# Altium footprint library LimeMicroAltiumLib.PcbLib: 760 footprints (part 22 of 50)
Each footprint in its own frame and in the unit in brackets; x right, y up, seen from the top. Pads: shape width x height; smd on the part's side, far side on the other; paste and mask are expansions set on the pad; w line width, h text height; cw(c..) or ccw(c..) is an arc to the next point about the centre after c.
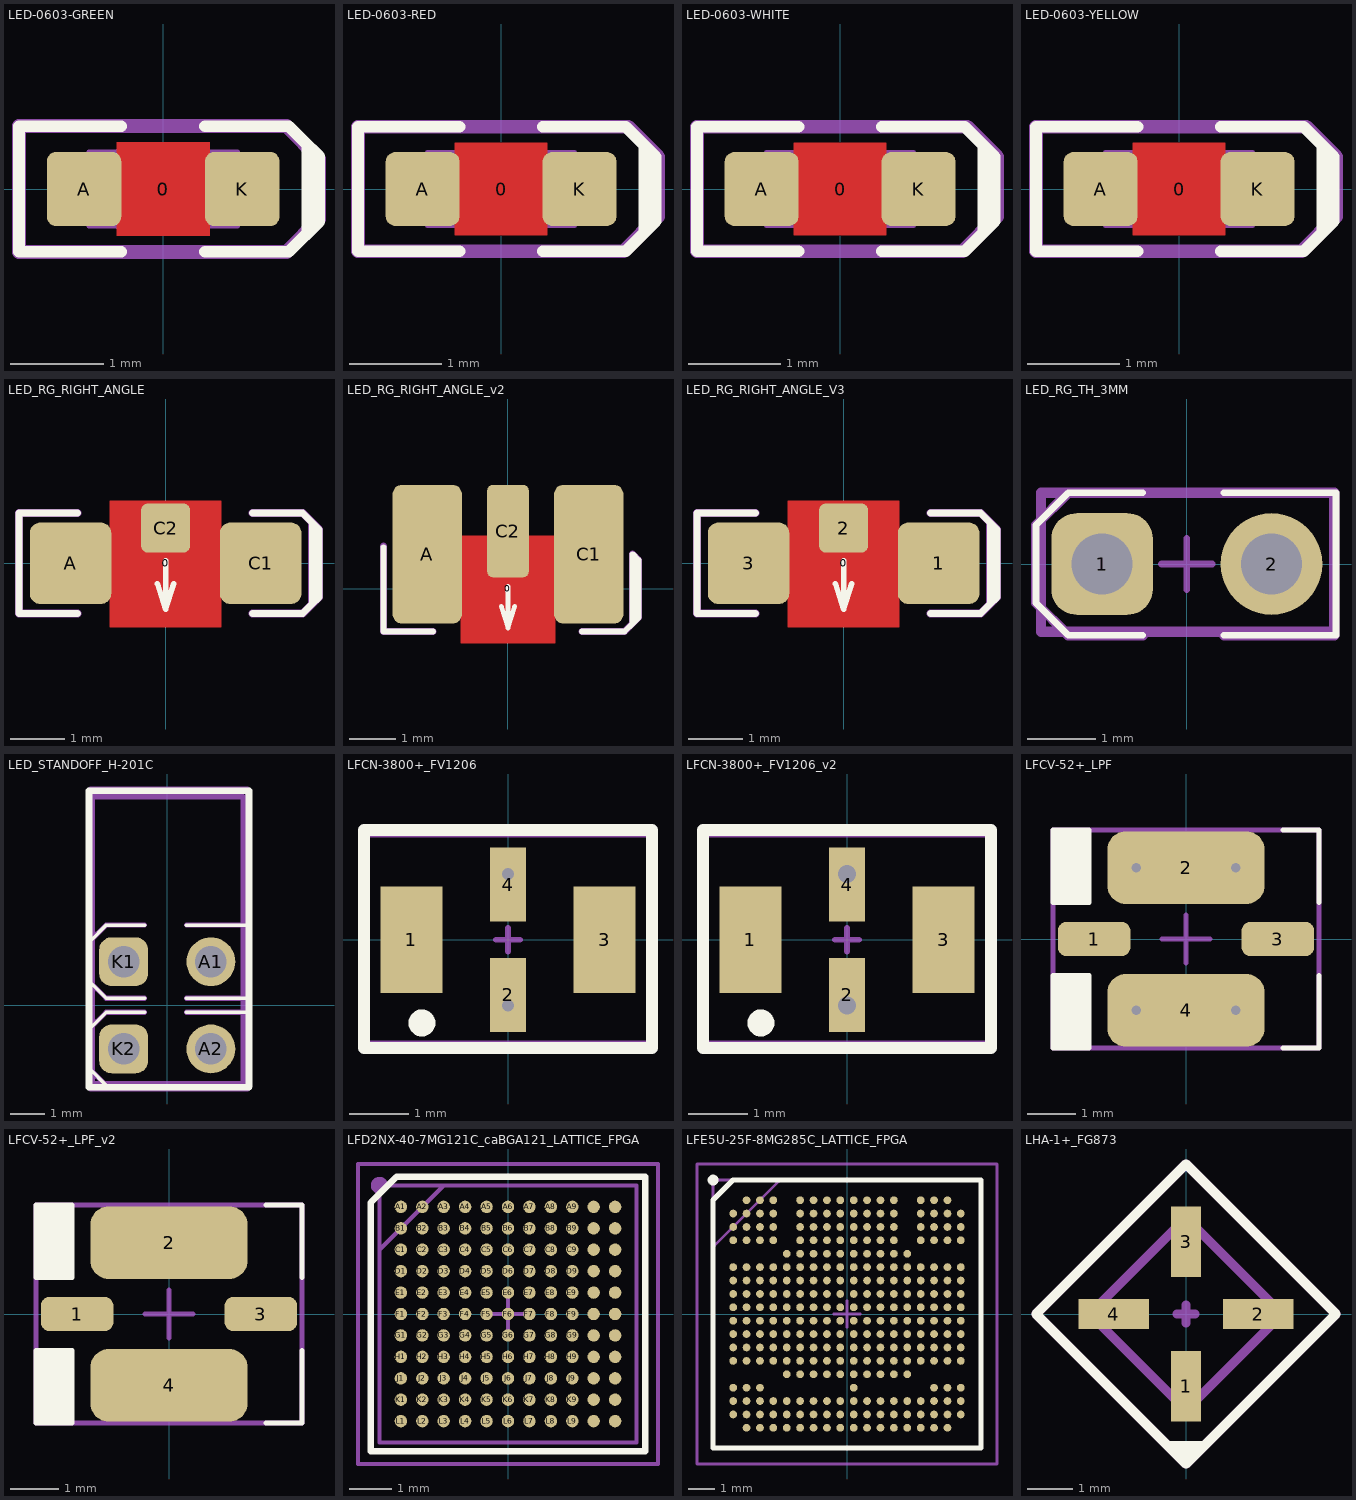
[diagram p21: the footprints below, top view; thin cyan lines are the x and y axes]

## LED-0603-GREEN [mm]
height 0.8
pads (3):
  round 0.254 on Mech15: 0(0,0)
  rrect25% 0.8x0.8 smd: A(-0.85,0) K(0.85,0)
Top Layer:
  pour cut-out: -0.5,0.5 0.5,0.5 0.5,-0.5 -0.5,-0.5
Top Overlay:
  lines w0.127: -0.45,-0.675 -1.55,-0.675 -1.55,0.675 -0.45,0.675 ; 0.45,-0.675 1.35,-0.675 1.55,-0.475 1.55,0.475 1.35,0.675 0.45,0.675 ; 1.5,0.525 1.675,0.35 1.675,-0.35 1.525,-0.5
Mechanical 13:
  lines w0.05: -0.6,-0.4 -0.6,0.399 0.6,0.4 0.6,-0.4 -0.6,-0.399 ; -0.505,-0.398 -0.505,0.398 ; -0.5,-0.4 -0.8,-0.4 -0.8,0.4 -0.5,0.4 ; 0.5,-0.4 0.8,-0.4 0.8,0.4 0.5,0.4 ; 0.505,-0.398 0.505,0.398 ; -0.599,-0.398 -0.599,0.398 0.599,0.398 0.599,-0.398 -0.599,-0.398
Mechanical 15:
  lines w0.15: -1.55,-0.675 -1.55,0.675 1.325,0.675 1.675,0.325 1.675,-0.325 1.325,-0.675 -1.55,-0.675
  text ".Designator" at 0,0 h0.55
  text "C" at 0.6,-0.3 h0.55
  text "A" at -1.2,-0.3 h0.55
3D body "LED 0603 APT1608 GREEN.STEP": height 0.75, standoff 0, extent -0.8,-0.4 0.8,0.4

## LED-0603-RED [mm]
height 0.8
pads (3):
  round 0.254 on Mech15: 0(0,0)
  rrect25% 0.8x0.8 smd: A(-0.85,0) K(0.85,0)
Top Layer:
  pour cut-out: -0.5,0.5 0.5,0.5 0.5,-0.5 -0.5,-0.5
Top Overlay:
  lines w0.127: -0.45,-0.675 -1.55,-0.675 -1.55,0.675 -0.45,0.675 ; 0.45,-0.675 1.35,-0.675 1.55,-0.475 1.55,0.475 1.35,0.675 0.45,0.675 ; 1.5,0.525 1.675,0.35 1.675,-0.35 1.525,-0.5
Mechanical 13:
  lines w0.05: -0.6,-0.4 -0.6,0.399 0.6,0.4 0.6,-0.4 -0.6,-0.399 ; -0.505,-0.398 -0.505,0.398 ; -0.5,-0.4 -0.8,-0.4 -0.8,0.4 -0.5,0.4 ; 0.5,-0.4 0.8,-0.4 0.8,0.4 0.5,0.4 ; 0.505,-0.398 0.505,0.398 ; -0.599,-0.398 0.599,-0.398 0.599,0.398 -0.599,0.398 -0.599,-0.398
Mechanical 15:
  lines w0.15: -1.55,-0.675 -1.55,0.675 1.375,0.675 1.7,0.35 1.7,-0.3 1.325,-0.675 -1.55,-0.675
  text ".Designator" at 0,0 h0.55
  text "C" at 0.6,-0.3 h0.55
  text "A" at -1.2,-0.3 h0.55
3D body "LED 0603 APT1608 RED.STEP": height 0.75, standoff 0, extent -0.8,-0.4 0.8,0.4

## LED-0603-WHITE [mm]
height 0.8
pads (3):
  round 0.254 on Mech15: 0(0,0)
  rrect25% 0.8x0.8 smd: A(-0.85,0) K(0.85,0)
Top Layer:
  pour cut-out: -0.5,0.5 0.5,0.5 0.5,-0.5 -0.5,-0.5
Top Overlay:
  lines w0.127: -0.45,-0.675 -1.55,-0.675 -1.55,0.675 -0.45,0.675 ; 0.45,-0.675 1.35,-0.675 1.55,-0.475 1.55,0.475 1.35,0.675 0.45,0.675 ; 1.5,0.525 1.675,0.35 1.675,-0.35 1.525,-0.5
Mechanical 13:
  lines w0.05: -0.6,-0.4 -0.6,0.399 0.6,0.4 0.6,-0.4 -0.6,-0.399 ; -0.505,-0.398 -0.505,0.398 ; -0.5,-0.4 -0.8,-0.4 -0.8,0.4 -0.5,0.4 ; 0.5,-0.4 0.8,-0.4 0.8,0.4 0.5,0.4 ; 0.505,-0.398 0.505,0.398 ; -0.599,-0.398 0.599,-0.398 0.599,0.398 -0.599,0.398 -0.599,-0.398
Mechanical 15:
  lines w0.15: -1.55,-0.675 1.325,-0.675 1.7,-0.3 1.7,0.35 1.375,0.675 -1.55,0.675 -1.55,-0.675
  text ".Designator" at 0,0 h0.55
  text "A" at -1.2,-0.3 h0.55
  text "C" at 0.6,-0.3 h0.55
3D body "LED 0603 APT1608 WHITE.STEP": height 0.75, standoff 0, extent -0.8,-0.4 0.8,0.4

## LED-0603-YELLOW [mm]
height 0.8
pads (3):
  round 0.254 on Mech15: 0(0,0)
  rrect25% 0.8x0.8 smd: A(-0.85,0) K(0.85,0)
Top Layer:
  pour cut-out: -0.5,0.5 0.5,0.5 0.5,-0.5 -0.5,-0.5
Top Overlay:
  lines w0.127: -0.45,-0.675 -1.55,-0.675 -1.55,0.675 -0.45,0.675 ; 0.45,-0.675 1.35,-0.675 1.55,-0.475 1.55,0.475 1.35,0.675 0.45,0.675 ; 1.5,0.525 1.675,0.35 1.675,-0.35 1.525,-0.5
Mechanical 13:
  lines w0.05: -0.6,-0.4 -0.6,0.399 0.6,0.4 0.6,-0.4 -0.6,-0.399 ; -0.505,-0.398 -0.505,0.398 ; -0.5,-0.4 -0.8,-0.4 -0.8,0.4 -0.5,0.4 ; 0.5,-0.4 0.8,-0.4 0.8,0.4 0.5,0.4 ; 0.505,-0.398 0.505,0.398 ; -0.599,-0.398 0.599,-0.398 0.599,0.398 -0.599,0.398 -0.599,-0.398
Mechanical 15:
  lines w0.15: -1.55,-0.675 1.325,-0.675 1.7,-0.3 1.7,0.35 1.375,0.675 -1.55,0.675 -1.55,-0.675
  text ".Designator" at 0,0 h0.55
  text "A" at -1.2,-0.3 h0.55
  text "C" at 0.6,-0.3 h0.55
3D body "LED 0603 APT1608 YELLOW.STEP": height 0.75, standoff 0, extent -0.8,-0.4 0.8,0.4

## LED_RG_RIGHT_ANGLE [mm] "LTST-S326KGJRKT"
height 1
pads (4):
  round 0.254 on Mech15: 0(0,0)
  rrect25% 1.5x1.5 smd: A(-1.75,0) C1(1.75,0)
  rrect25% 0.9x0.9 smd: C2(0,0.65)
Top Layer:
  pour cut-out: -1.025,1.15 1.025,1.15 1.025,-1.175 -1.025,-1.175
Top Overlay:
  lines w0.1: -0.15,-0.375 0,-0.85 ; 0,0.05 0,-0.85 ; 0.15,-0.375 0,-0.85
  lines w0.127: -2.7,0.9 -2.7,-0.925 -1.625,-0.925 ; -2.7,0.925 -1.625,0.925 ; 1.6,-0.925 2.35,-0.925 ; 1.6,0.925 2.35,0.925 ; 2.325,-0.925 2.525,-0.925 2.7,-0.75 ; 2.325,0.925 2.525,0.925 2.7,0.75 ; 2.7,-0.75 2.7,0.75 ; 2.7,-0.75 2.825,-0.625 2.825,0.625 2.7,0.75
Mechanical 15:
  lines w0.05: -1.5,-0.037 -1.25,-0.037 ; -0.525,-0.625 -0.525,-0.175 ; -0.525,0.1 -0.525,0.55 ; -0.25,0.325 -1.25,0.325 -1.25,-0.4 1.125,-0.4 ; -0.925,-0.625 -0.925,-0.175 -0.525,-0.4 -0.925,-0.625 ; -0.925,0.1 -0.525,0.325 -0.925,0.55 -0.925,0.1
  lines w0.15: -1.625,-0.925 -2.7,-0.925 -2.7,0.925 -1.625,0.925 ; 1.6,-0.925 2.35,-0.925 ; 1.6,0.925 2.35,0.925 ; 2.325,-0.925 2.525,-0.925 2.7,-0.75 ; 2.325,0.925 2.525,0.925 2.7,0.75 ; 2.7,-0.75 2.825,-0.625 2.825,0.625 2.7,0.75 ; 2.7,-0.75 2.7,0.75
  text ".Designator" at -0.04,0.025 h0.55
  text "A" at -1.95,-0.2 h0.55
  text "C1" at 1.45,-0.3 h0.55
3D body: height 0.99, standoff 0, extent -1.04,-1.475 0.96,0.525
3D body: height 1, standoff 0, extent -1.54,-0.475 1.46,0.525

## LED_RG_RIGHT_ANGLE_v2 [mm] "LTST-S326KGJRKT"
height 1
pads (4):
  round 0.254 on Mech15: 0(0,0)
  rrect25% 1.5x3 smd: A(-1.75,0.75) C1(1.75,0.75)
  rrect25% 0.9x2 smd: C2(0,1.25)
Top Layer:
  pour cut-out: -1.025,1.15 1.025,1.15 1.025,-1.175 -1.025,-1.175
Top Overlay:
  lines w0.1: -0.15,-0.375 0,-0.85 ; 0,0.05 0,-0.85 ; 0.15,-0.375 0,-0.85
  lines w0.127: -2.7,0.9 -2.7,-0.925 -1.625,-0.925 ; 1.6,-0.925 2.35,-0.925 ; 2.325,-0.925 2.525,-0.925 2.7,-0.75 ; 2.7,-0.75 2.7,0.75 2.825,0.625 2.825,-0.625 2.7,-0.75
Mechanical 15:
  lines w0.05: -1.5,-0.037 -1.25,-0.037 ; -0.525,-0.625 -0.525,-0.175 ; -0.525,0.1 -0.525,0.55 ; -0.25,0.325 -1.25,0.325 -1.25,-0.4 1.125,-0.4 ; -0.925,-0.625 -0.925,-0.175 -0.525,-0.4 -0.925,-0.625 ; -0.925,0.1 -0.525,0.325 -0.925,0.55 -0.925,0.1
  lines w0.15: -2.7,0.925 -2.7,-0.925 -1.625,-0.925 ; 1.6,-0.925 2.35,-0.925 ; 2.325,-0.925 2.525,-0.925 2.7,-0.75 ; 2.7,-0.75 2.825,-0.625 2.825,0.625 2.7,0.75 2.7,-0.75
  text ".Designator" at -0.04,0.025 h0.55
  text "A" at -1.95,-0.275 h0.55
  text "C1" at 1.45,-0.3 h0.55
3D body: height 0.99, standoff 0, extent -1.04,-1.475 0.96,0.525
3D body: height 1, standoff 0, extent -1.54,-0.475 1.46,0.525

## LED_RG_RIGHT_ANGLE_V3 [mm] "LTST-S326KGJRKT"
height 1
pads (4):
  round 0.254 on Mech15: 0(0,0)
  rrect25% 1.5x1.5 smd: 1(1.75,0) 3(-1.75,0)
  rrect25% 0.9x0.9 smd: 2(0,0.65)
Top Layer:
  pour cut-out: -1.025,1.15 1.025,1.15 1.025,-1.175 -1.025,-1.175
Top Overlay:
  lines w0.1: -0.15,-0.375 0,-0.85 ; 0,0.05 0,-0.85 ; 0.15,-0.375 0,-0.85
  lines w0.127: -2.7,0.9 -2.7,-0.925 -1.625,-0.925 ; -2.7,0.925 -1.625,0.925 ; 1.6,-0.925 2.35,-0.925 ; 1.6,0.925 2.35,0.925 ; 2.325,-0.925 2.525,-0.925 2.7,-0.75 ; 2.325,0.925 2.525,0.925 2.7,0.75 ; 2.7,-0.75 2.7,0.75 ; 2.7,-0.75 2.825,-0.625 2.825,0.625 2.7,0.75
Mechanical 15:
  lines w0.05: -1.5,-0.037 -1.25,-0.037 ; -0.525,-0.625 -0.525,-0.175 ; -0.525,0.1 -0.525,0.55 ; -0.25,0.325 -1.25,0.325 -1.25,-0.4 1.125,-0.4 ; -0.925,-0.625 -0.525,-0.4 -0.925,-0.175 -0.925,-0.625 ; -0.925,0.1 -0.925,0.55 -0.525,0.325 -0.925,0.1
  lines w0.15: -1.625,-0.925 -2.7,-0.925 -2.7,0.925 -1.625,0.925 ; 1.6,-0.925 2.35,-0.925 ; 1.6,0.925 2.35,0.925 ; 2.325,-0.925 2.525,-0.925 2.7,-0.75 ; 2.325,0.925 2.525,0.925 2.7,0.75 ; 2.7,-0.75 2.825,-0.625 2.825,0.625 2.7,0.75 ; 2.7,-0.75 2.7,0.75
  text ".Designator" at -0.04,0.025 h0.55
  text "A" at -2.05,-0.15 h0.55
  text "C1" at -0.4,0.6 h0.55
  text "C2" at 1.525,-0.175 h0.55
3D body: height 0.99, standoff 0, extent -1.04,-1.475 0.96,0.525
3D body: height 1, standoff 0, extent -1.54,-0.475 1.46,0.525

## LED_RG_TH_3MM [mm] "Bivar Inc. 4301F1/5-A red green throughole LED"
pads (2):
  rrect50% 1.5x1.5 hole 0.9: 1(-1.25,0)
  round 1.5 hole 0.9: 2(1.25,0)
Top Overlay:
  lines w0.1: -0.65,-1.05 -1.75,-1.05 -2.225,-0.575 -2.225,0.125 -2.225,0.575 -1.75,1.05 -0.65,1.05 ; 0.55,-1.05 2.2,-1.05 2.2,1.05 0.55,1.05
Mechanical 13:
  lines w0.15: -2.15,-1 2.175,-1 2.175,1.05 -2.15,1.05 -2.15,-1
Mechanical 15:
  lines w0.1: -0.375,0 0,0 ; 0,-0.375 0,0 ; 0,0.375 0,0 ; 0.375,0 0,0
  lines w0.15: -0.65,-1.05 -1.75,-1.05 -2.225,-0.575 -2.225,0.125 -2.225,0.575 -1.75,1.05 -0.65,1.05 ; 0.55,-1.05 2.15,-1.05 2.175,-1.05 2.175,1.05 0.55,1.05
  text "1" at -1.4,-0.25 h0.55
  text "2" at 1.1,-0.25 h0.55
  text ".Designator" at 0,-0.05 h0.55

## LED_STANDOFF_H-201C [mm] "Bivar Inc. H-201C"
pads (4):
  round 1.4 hole 0.9: A1(1.25,1.25) A2(1.25,-1.25)
  rrect50% 1.4x1.4 hole 0.9: K1(-1.25,1.25) K2(-1.25,-1.25)
Top Overlay:
  lines w0.1: -0.65,-2.3 -1.75,-2.3 -2.225,-1.825 -2.225,-1.125 -2.225,-0.675 -1.75,-0.2 -0.65,-0.2 ; -0.65,0.2 -1.75,0.2 -2.225,0.675 -2.225,1.375 -2.225,1.825 -1.75,2.3 -0.65,2.3 ; 0.55,-2.3 2.15,-2.3 ; 0.55,-0.2 2.3,-0.2 ; 0.55,0.2 2.3,0.2 ; 0.55,2.3 2.3,2.3
  lines w0.2: -2.25,-2.35 2.325,-2.35 2.35,-2.325 2.35,1.25 2.35,6.15 -2.25,6.15 -2.25,1.25 -2.25,-2.35
Mechanical 13:
  lines w0.15: -2.15,-2.25 2.175,-2.25 2.175,5.975 -2.15,5.975 -2.15,-2.25
Mechanical 15:
  lines w0.15: -0.65,-2.3 -1.75,-2.3 -2.225,-1.825 -2.225,-1.125 -2.225,-0.675 -1.75,-0.2 -0.65,-0.2 ; -0.65,0.2 -1.75,0.2 -2.225,0.675 -2.225,1.375 -2.225,1.825 -1.75,2.3 -0.65,2.3 ; 0.55,-2.3 2.15,-2.3 ; 0.55,-0.2 2.175,-0.2 ; 0.55,0.2 2.15,0.2 ; 0.55,2.3 2.175,2.3 ; -2.2,-2.4 2.3,-2.4 2.3,2.1 2.3,6.2 -2.2,6.2 -2.2,-2.4
  text "PCB edge" at -1.8,5.5 h0.5
  text "C" at -1.5,0.9 h0.55
  text "A" at 1,1 h0.55
  text "C" at -1.4,-1.6 h0.55
  text "A" at 1,-1.5 h0.55
  text ".Designator" at 0,0 h0.55
3D body "3mm_LED_holder_x2.STEP": height 9.7, standoff -2.6, extent -2.225,-1.925 2.375,9.175

## LFCN-3800+_FV1206 [mm]
pads (4):
  rect 1.04x1.8 smd: 1(-1.625,0) 3(1.625,0)
  rect 0.61x1.245 smd: 2(0,-0.927) 4(0,0.927)
via 0,1.105 diameter 0.6 hole 0.2
via 0,-1.105 diameter 0.6 hole 0.2
Top Overlay:
  circle w0.254: c-1.45,-1.4 r0.1
  lines w0.2: -2.425,-1.825 2.425,-1.825 2.425,1.85 -2.425,1.85 -2.425,-1.825
Mechanical 15:
  circle w0.254: c-1.6,0 r0.1
  lines w0.1: -0.2,0 0,0 ; 0,-0.2 0,0 ; 0,0.2 0,0 ; 0.2,0 0,0 ; -2.375,-1.75 2.375,-1.75 2.375,1.775 -2.375,1.775 -2.375,-1.75
  text ".Designator" at 0,0 h0.55
3D body "User Library-LFCN-2250.STEP": height 0.94, standoff 0, extent -1.6,-0.8 1.6,0.8

## LFCN-3800+_FV1206_v2 [mm]
pads (4):
  rect 1.04x1.8 smd: 1(-1.625,0) 3(1.625,0)
  rect 0.61x1.245 smd: 2(0,-0.927) 4(0,0.927)
via 0,-1.105 diameter 0.6 hole 0.3
via 0,1.105 diameter 0.6 hole 0.3
Top Overlay:
  circle w0.254: c-1.45,-1.4 r0.1
  lines w0.2: -2.425,-1.825 -2.425,1.85 2.425,1.85 2.425,-1.825 -2.425,-1.825
Mechanical 15:
  circle w0.254: c-1.6,0 r0.1
  lines w0.1: -0.2,0 0,0 ; 0,-0.2 0,0 ; 0,0.2 0,0 ; 0.2,0 0,0 ; -2.375,-1.75 -2.375,1.775 2.375,1.775 2.375,-1.75 -2.375,-1.75
  text ".Designator" at 0,0 h0.55
3D body "User Library-LFCN-2250.STEP": height 0.94, standoff 0, extent -1.6,-0.8 1.6,0.8

## LFCV-52+_LPF [mm]
pads (4):
  rrect50% 1.5x0.71 smd mask+0.05: 1(-1.9,0) 3(1.9,0)
  rrect50% 3.25x1.5 smd mask+0.05: 2(0,1.475) 4(0,-1.475)
via -1.025,1.475 diameter 0.4 hole 0.2
via 1.025,1.475 diameter 0.4 hole 0.2
via 1.025,-1.475 diameter 0.4 hole 0.2
via -1.025,-1.475 diameter 0.4 hole 0.2
Top Overlay:
  region: -2.75,0.75 -2.75,2.25 -2,2.25 -2,0.75
  region: -2.75,-0.75 -2.75,-2.25 -2,-2.25 -2,-0.75
  lines w0.1: 2,-2.25 2.75,-2.25 2.75,-0.75 ; 2,2.25 2.75,2.25 2.75,0.75 ; -2.75,-2.25 -2.75,-0.75 -2,-0.75 -2,-2.25 -2.75,-2.25 ; -2.75,0.75 -2.75,2.25 -2,2.25 -2,0.75 -2.75,0.75
Mechanical 15:
  lines w0.1: -0.5,0 0,0 ; 0,-0.5 0,0 ; 0,0.5 0,0 ; 0.5,0 0,0 ; -2.75,-2.25 -2.75,2.25 2.75,2.25 2.75,-2.25 -0.5,-2.25 -2.75,-2.25
  text "1" at -2.25,-0.25 h0.55
  text "3" at 2,-0.25 h0.55
  text ".Designator" at 0,0 h0.55
3D body: height 1.55, standoff 1.5, extent -1.3,-0.3 -0.3,0.3
3D body: height 1.5, standoff 0, extent -1.6,-1.25 1.6,1.25

## LFCV-52+_LPF_v2 [mm]
pads (4):
  rrect50% 1.5x0.71 smd mask+0.05: 1(-1.9,0) 3(1.9,0)
  rrect50% 3.25x1.5 smd mask+0.05: 2(0,1.475) 4(0,-1.475)
Top Overlay:
  region: -2.75,0.75 -2.75,2.25 -2,2.25 -2,0.75
  region: -2.75,-0.75 -2.75,-2.25 -2,-2.25 -2,-0.75
  lines w0.1: 2,-2.25 2.75,-2.25 2.75,-0.75 ; 2,2.25 2.75,2.25 2.75,0.75 ; -2.75,-2.25 -2.75,-0.75 -2,-0.75 -2,-2.25 -2.75,-2.25 ; -2.75,0.75 -2.75,2.25 -2,2.25 -2,0.75 -2.75,0.75
Mechanical 15:
  lines w0.1: -0.5,0 0,0 ; 0,-0.5 0,0 ; 0,0.5 0,0 ; 0.5,0 0,0 ; -2.75,-2.25 -2.75,2.25 2.75,2.25 2.75,-2.25 -0.5,-2.25 -2.75,-2.25
  text "GND vias to be added manually" at -2.4,-2.1 h0.35
  text "1" at -2.25,-0.25 h0.55
  text "3" at 2,-0.25 h0.55
  text ".Designator" at 0,0 h0.55
3D body: height 1.55, standoff 1.5, extent -1.3,-0.3 -0.3,0.3
3D body: height 1.5, standoff 0, extent -1.6,-1.25 1.6,1.25

## LFD2NX-40-7MG121C_caBGA121_LATTICE_FPGA [mm]
pads (121):
  round 0.29 smd mask+0.05: A1(-2.5,2.5) A2(-2,2.5) A3(-1.5,2.5) A4(-1,2.5) A5(-0.5,2.5) A6(0,2.5) A7(0.5,2.5) A8(1,2.5) A9(1.5,2.5) A10(2,2.5) A11(2.5,2.5) B1(-2.5,2) B2(-2,2) B3(-1.5,2) B4(-1,2) B5(-0.5,2) B6(0,2) B7(0.5,2) B8(1,2) B9(1.5,2) B10(2,2) B11(2.5,2) C1(-2.5,1.5) C2(-2,1.5) C3(-1.5,1.5) C4(-1,1.5) C5(-0.5,1.5) C6(0,1.5) C7(0.5,1.5) C8(1,1.5) C9(1.5,1.5) C10(2,1.5) C11(2.5,1.5) D1(-2.5,1) D2(-2,1) D3(-1.5,1) D4(-1,1) D5(-0.5,1) D6(0,1) D7(0.5,1) D8(1,1) D9(1.5,1) D10(2,1) D11(2.5,1) E1(-2.5,0.5) E2(-2,0.5) E3(-1.5,0.5) E4(-1,0.5) E5(-0.5,0.5) E6(0,0.5) E7(0.5,0.5) E8(1,0.5) E9(1.5,0.5) E10(2,0.5) E11(2.5,0.5) F1(-2.5,0) F2(-2,0) F3(-1.5,0) F4(-1,0) F5(-0.5,0) F6(0,0) F7(0.5,0) F8(1,0) F9(1.5,0) F10(2,0) F11(2.5,0) G1(-2.5,-0.5) G2(-2,-0.5) G3(-1.5,-0.5) G4(-1,-0.5) G5(-0.5,-0.5) G6(0,-0.5) G7(0.5,-0.5) G8(1,-0.5) G9(1.5,-0.5) G10(2,-0.5) G11(2.5,-0.5) H1(-2.5,-1) H2(-2,-1) H3(-1.5,-1) H4(-1,-1) H5(-0.5,-1) H6(0,-1) H7(0.5,-1) H8(1,-1) H9(1.5,-1) H10(2,-1) H11(2.5,-1) J1(-2.5,-1.5) J2(-2,-1.5) J3(-1.5,-1.5) J4(-1,-1.5) J5(-0.5,-1.5) J6(0,-1.5) J7(0.5,-1.5) J8(1,-1.5) J9(1.5,-1.5) J10(2,-1.5) J11(2.5,-1.5) K1(-2.5,-2) K2(-2,-2) K3(-1.5,-2) K4(-1,-2) K5(-0.5,-2) K6(0,-2) K7(0.5,-2) K8(1,-2) K9(1.5,-2) K10(2,-2) K11(2.5,-2) L1(-2.5,-2.5) L2(-2,-2.5) L3(-1.5,-2.5) L4(-1,-2.5) L5(-0.5,-2.5) L6(0,-2.5) L7(0.5,-2.5) L8(1,-2.5) L9(1.5,-2.5) L10(2,-2.5) L11(2.5,-2.5)
Top Overlay:
  lines w0.15: -3.2,-3.2 3.2,-3.2 3.2,3.2 -2.6,3.2 -3.2,2.6 -3.2,-3.2
Mechanical 13:
  lines w0.1: -3,1.5 -1.5,3 ; -3,-3 3,-3 3,3 -3,3 -3,-3
Mechanical 15:
  circle w0.2: c-3,3 r0.1
  lines w0.1: -0.5,0 0,0 ; 0,-0.5 0,0 ; 0,0.5 0,0 ; 0.5,0 0,0 ; -3.5,-3.5 3.5,-3.5 3.5,3.5 -3.5,3.5 -3.5,-3.5
  text ".Designator" at 0,0 h0.55
  text "A1" at -2.7,2.2 h0.55
  text "L1" at -2.7,-2.8 h0.55
  text "L11" at 2,-2.8 h0.55
  text "A11" at 2,2.2 h0.55
3D body "LFD2NX-40-7MG121C.stp": height 1, standoff 0, extent -3,-3 3,3

## LFE5U-25F-8MG285C_LATTICE_FPGA [mm] "285-ball csfBGA (MG285)"
pads (285):
  round 0.29 smd mask+0.05: A2(-3.75,4.25) A3(-3.25,4.25) A4(-2.75,4.25) A6(-1.75,4.25) A7(-1.25,4.25) A8(-0.75,4.25) A9(-0.25,4.25) A10(0.25,4.25) A11(0.75,4.25) A12(1.25,4.25) A13(1.75,4.25) A15(2.75,4.25) A16(3.25,4.25) A17(3.75,4.25) B1(-4.25,3.75) B2(-3.75,3.75) B3(-3.25,3.75) B4(-2.75,3.75) B6(-1.75,3.75) B7(-1.25,3.75) B8(-0.75,3.75) B9(-0.25,3.75) B10(0.25,3.75) B11(0.75,3.75) B12(1.25,3.75) B13(1.75,3.75) B15(2.75,3.75) B16(3.25,3.75) B17(3.75,3.75) B18(4.25,3.75) C1(-4.25,3.25) C2(-3.75,3.25) C3(-3.25,3.25) C4(-2.75,3.25) C6(-1.75,3.25) C7(-1.25,3.25) C8(-0.75,3.25) C9(-0.25,3.25) C10(0.25,3.25) C11(0.75,3.25) C12(1.25,3.25) C13(1.75,3.25) C15(2.75,3.25) C16(3.25,3.25) C17(3.75,3.25) C18(4.25,3.25) D1(-4.25,2.75) D2(-3.75,2.75) D3(-3.25,2.75) D4(-2.75,2.75) D6(-1.75,2.75) D7(-1.25,2.75) D8(-0.75,2.75) D9(-0.25,2.75) D10(0.25,2.75) D11(0.75,2.75) D12(1.25,2.75) D13(1.75,2.75) D15(2.75,2.75) D16(3.25,2.75) D17(3.75,2.75) D18(4.25,2.75) E5(-2.25,2.25) E6(-1.75,2.25) E7(-1.25,2.25) E8(-0.75,2.25) E9(-0.25,2.25) E10(0.25,2.25) E11(0.75,2.25) E12(1.25,2.25) E13(1.75,2.25) E14(2.25,2.25) F1(-4.25,1.75) F2(-3.75,1.75) F3(-3.25,1.75) F4(-2.75,1.75) F5(-2.25,1.75) F6(-1.75,1.75) F7(-1.25,1.75) F8(-0.75,1.75) F9(-0.25,1.75) F10(0.25,1.75) F11(0.75,1.75) F12(1.25,1.75) F13(1.75,1.75) F14(2.25,1.75) F15(2.75,1.75) F16(3.25,1.75) F17(3.75,1.75) F18(4.25,1.75) G1(-4.25,1.25) G2(-3.75,1.25) G3(-3.25,1.25) G4(-2.75,1.25) G5(-2.25,1.25) G6(-1.75,1.25) G7(-1.25,1.25) G8(-0.75,1.25) G9(-0.25,1.25) G10(0.25,1.25) G11(0.75,1.25) G12(1.25,1.25) G13(1.75,1.25) G14(2.25,1.25) G15(2.75,1.25) G16(3.25,1.25) G17(3.75,1.25) G18(4.25,1.25) H1(-4.25,0.75) H2(-3.75,0.75) H3(-3.25,0.75) H4(-2.75,0.75) H5(-2.25,0.75) H6(-1.75,0.75) H7(-1.25,0.75) H8(-0.75,0.75) H9(-0.25,0.75) H10(0.25,0.75) H11(0.75,0.75) H12(1.25,0.75) H13(1.75,0.75) H14(2.25,0.75) H15(2.75,0.75) H16(3.25,0.75) H17(3.75,0.75) H18(4.25,0.75) J1(-4.25,0.25) J2(-3.75,0.25) J3(-3.25,0.25) J4(-2.75,0.25) J5(-2.25,0.25) J6(-1.75,0.25) J7(-1.25,0.25) J8(-0.75,0.25) J9(-0.25,0.25) J10(0.25,0.25) J11(0.75,0.25) J12(1.25,0.25) J13(1.75,0.25) J14(2.25,0.25) J15(2.75,0.25) J16(3.25,0.25) J17(3.75,0.25) J18(4.25,0.25) K1(-4.25,-0.25) K2(-3.75,-0.25) K3(-3.25,-0.25) K4(-2.75,-0.25) K5(-2.25,-0.25) K6(-1.75,-0.25) K7(-1.25,-0.25) K8(-0.75,-0.25) K9(-0.25,-0.25) K10(0.25,-0.25) K11(0.75,-0.25) K12(1.25,-0.25) K13(1.75,-0.25) K14(2.25,-0.25) K15(2.75,-0.25) K16(3.25,-0.25) K17(3.75,-0.25) K18(4.25,-0.25) L1(-4.25,-0.75) L2(-3.75,-0.75) L3(-3.25,-0.75) L4(-2.75,-0.75) L5(-2.25,-0.75) L6(-1.75,-0.75) L7(-1.25,-0.75) L8(-0.75,-0.75) L9(-0.25,-0.75) L10(0.25,-0.75) L11(0.75,-0.75) L12(1.25,-0.75) L13(1.75,-0.75) L14(2.25,-0.75) L15(2.75,-0.75) L16(3.25,-0.75) L17(3.75,-0.75) L18(4.25,-0.75) M1(-4.25,-1.25) M2(-3.75,-1.25) M3(-3.25,-1.25) M4(-2.75,-1.25) M5(-2.25,-1.25) M6(-1.75,-1.25) M7(-1.25,-1.25) M8(-0.75,-1.25) M9(-0.25,-1.25) M10(0.25,-1.25) M11(0.75,-1.25) M12(1.25,-1.25) M13(1.75,-1.25) M14(2.25,-1.25) M15(2.75,-1.25) M16(3.25,-1.25) M17(3.75,-1.25) M18(4.25,-1.25) N1(-4.25,-1.75) N2(-3.75,-1.75) N3(-3.25,-1.75) N4(-2.75,-1.75) N5(-2.25,-1.75) N6(-1.75,-1.75) N7(-1.25,-1.75) N8(-0.75,-1.75) N9(-0.25,-1.75) N10(0.25,-1.75) N11(0.75,-1.75) N12(1.25,-1.75) N13(1.75,-1.75) N14(2.25,-1.75) N15(2.75,-1.75) N16(3.25,-1.75) N17(3.75,-1.75) N18(4.25,-1.75) P5(-2.25,-2.25) P6(-1.75,-2.25) P7(-1.25,-2.25) P8(-0.75,-2.25) P9(-0.25,-2.25) P10(0.25,-2.25) P11(0.75,-2.25) P12(1.25,-2.25) P13(1.75,-2.25) P14(2.25,-2.25) R1(-4.25,-2.75) R2(-3.75,-2.75) R3(-3.25,-2.75) R10(0.25,-2.75) R16(3.25,-2.75) R17(3.75,-2.75) R18(4.25,-2.75) T1(-4.25,-3.25) T2(-3.75,-3.25) T3(-3.25,-3.25) T4(-2.75,-3.25) T5(-2.25,-3.25) T6(-1.75,-3.25) T7(-1.25,-3.25) T8(-0.75,-3.25) T9(-0.25,-3.25) T10(0.25,-3.25) T11(0.75,-3.25) T12(1.25,-3.25) T13(1.75,-3.25) T14(2.25,-3.25) T15(2.75,-3.25) T16(3.25,-3.25) T17(3.75,-3.25) T18(4.25,-3.25) U1(-4.25,-3.75) U2(-3.75,-3.75) U3(-3.25,-3.75) U4(-2.75,-3.75) U5(-2.25,-3.75) U6(-1.75,-3.75) U7(-1.25,-3.75) U8(-0.75,-3.75) U9(-0.25,-3.75) U10(0.25,-3.75) U11(0.75,-3.75) U12(1.25,-3.75) U13(1.75,-3.75) U14(2.25,-3.75) U15(2.75,-3.75) U16(3.25,-3.75) U17(3.75,-3.75) U18(4.25,-3.75) V2(-3.75,-4.25) V3(-3.25,-4.25) V4(-2.75,-4.25) V5(-2.25,-4.25) V6(-1.75,-4.25) V7(-1.25,-4.25) V8(-0.75,-4.25) V9(-0.25,-4.25) V10(0.25,-4.25) V11(0.75,-4.25) V12(1.25,-4.25) V13(1.75,-4.25) V14(2.25,-4.25) V15(2.75,-4.25) V16(3.25,-4.25) V17(3.75,-4.25)
Top Overlay:
  circle w0.2: c-5,5 r0.1
  lines w0.2: -5,-5 -5,4.25 -4.25,5 5,5 5,-5 -5,-5
Mechanical 13:
  lines w0.1: -5,2.5 -2.5,5 ; -5,-5 5,-5 5,5 -5,5 -5,-5
Mechanical 15:
  lines w0.1: -5,2.5 -2.5,5 ; -0.5,0 0.5,0 ; 0,-0.5 0,0.5 ; -5.6,-5.6 -5.6,5.6 5.6,5.6 5.6,-5.6 -5.6,-5.6 ; -5,-5 -5,5 5,5 5,-5 -5,-5
  text ".Designator" at 0,0 h0.55
3D body "LFE5U-25F-6MG285C.stp": height 1.3, standoff 0, extent -5,-5 5,5

## LHA-1+_FG873 [mm]
pads (4):
  rect 0.65x1.55 smd: 1(0,-1.59) 3(0,1.59)
  rect 1.55x0.65 smd: 2(1.59,0) 4(-1.59,0)
Top Overlay:
  region: -0.5,-2.8 0.5,-2.8 0,-3.3
  lines w0.2: -3.3,0 0,-3.3 3.3,0 0,3.3 -3.3,0
Mechanical 13:
  lines w0.2: -2.12,0 0,-2.12 2.12,0 0,2.12 -2.12,0 ; -2.12,0 -2.12,0
Mechanical 15:
  circle w0.254: c0,-1.6 r0.056
  lines w0.2: -0.2,0 0,0 ; 0,-0.2 0,0 ; 0,0.2 0,0 ; 0.2,0 0,0 ; -3.3,0 0,-3.3 3.3,0 0,3.3 -3.3,0
  text ".Designator" at 0,0 h0.55
3D body "User Library-MINI-CIRCUITS_FG873.STEP": height 0.89, standoff -0.01, extent -2.122,-2.121 2.121,2.121